# Altium footprint library pinghengche.PcbLib: 128 footprints (part 4 of 8)
Each footprint in its own frame and in the unit in brackets; x right, y up, seen from the top. Pads: shape width x height; smd on the part's side, far side on the other; paste and mask are expansions set on the pad; w line width, h text height; cw(c..) or ccw(c..) is an arc to the next point about the centre after c.
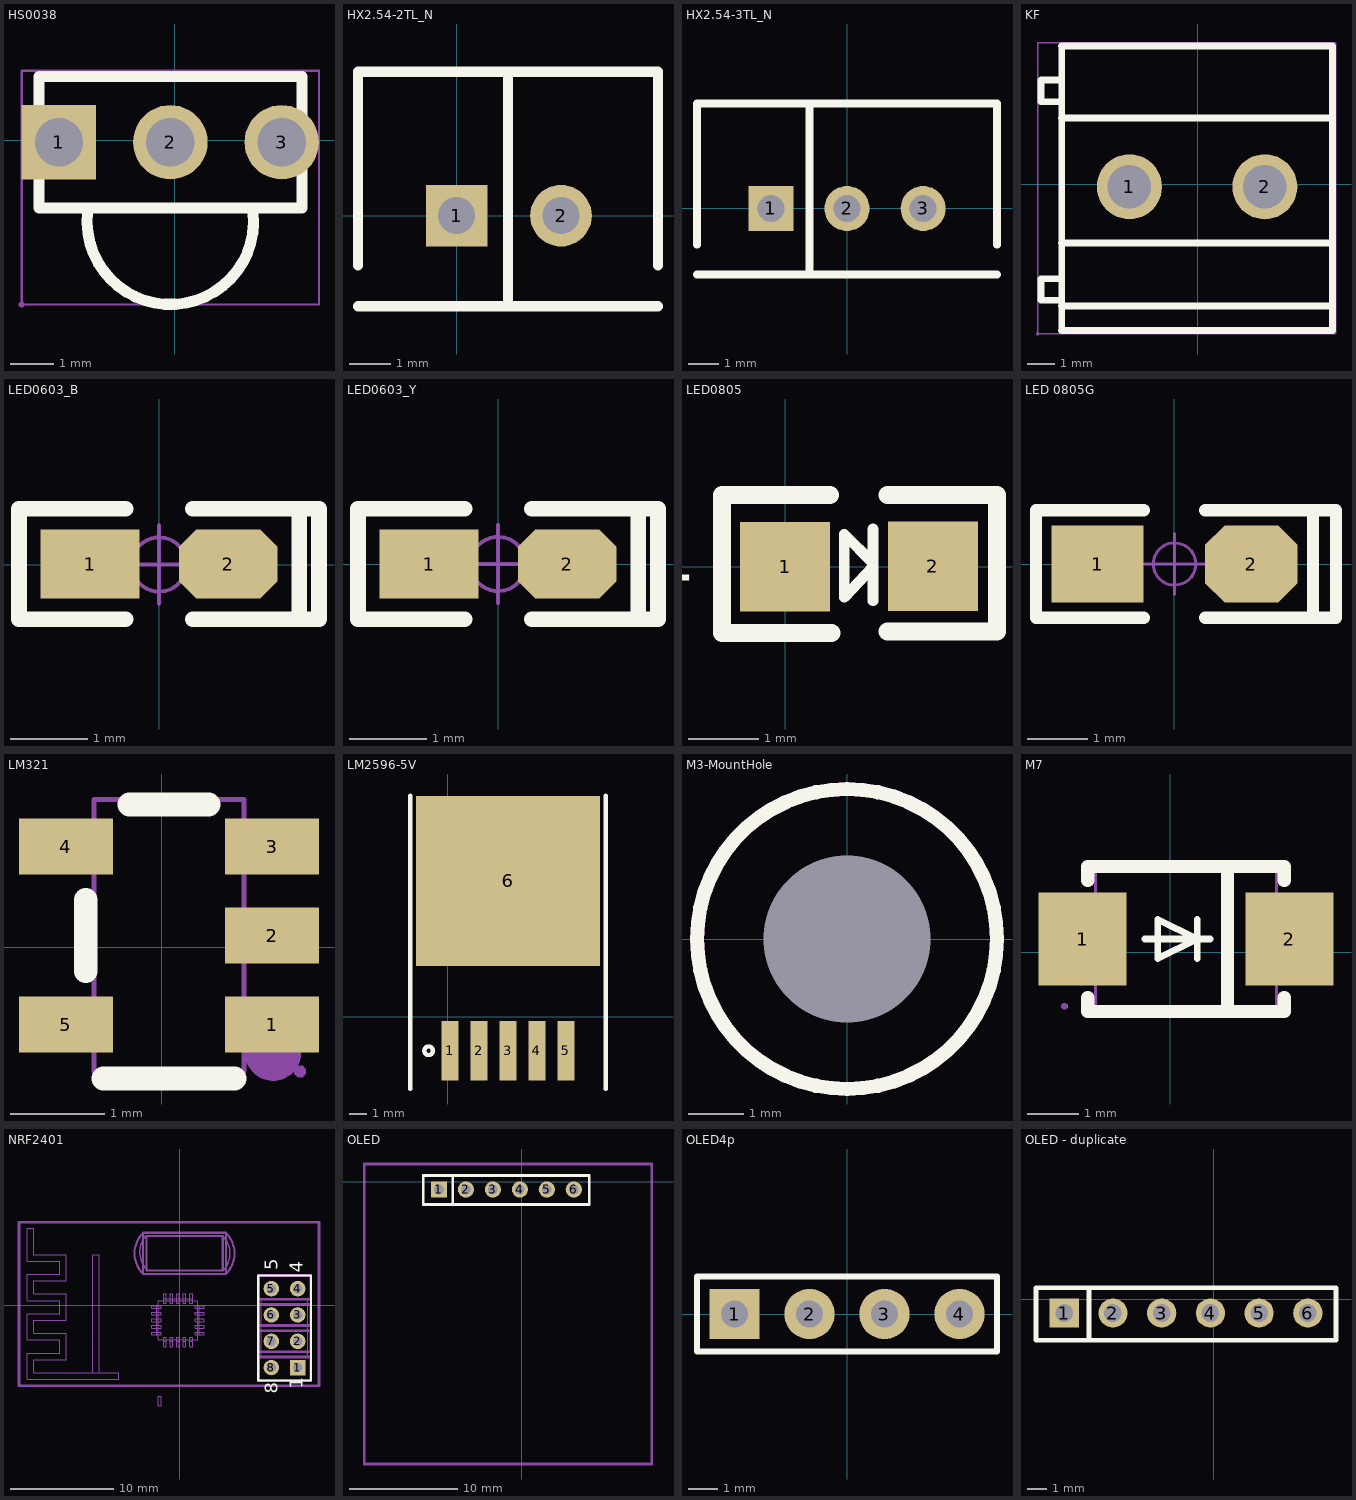
[diagram p3: the footprints below, top view; thin cyan lines are the x and y axes]

## HS0038 [mm]
pads (3):
  rect 1.699x1.699 hole 1.1 mask+0.051: 1(-2.644,-0.048)
  round 1.699 hole 1.1 mask+0.051: 2(-0.104,-0.048) 3(2.436,-0.048)
Top Overlay:
  lines w0.254: -1.994,-1.65 ccw(c-0.104,-1.848) 1.785,-1.65 ; -3.104,-1.547 2.896,-1.547 2.896,1.453 -3.104,1.453 -3.104,-1.547
Mechanical 15:
  region: -2.195,-0.048 -2.195,0.041 -2.263,0.206 -2.389,0.333 -2.555,0.401 -2.734,0.401 -2.899,0.333 -3.025,0.206 -3.094,0.041 -3.094,-0.048 -3.094,-0.138 -3.025,-0.303 -2.899,-0.429 -2.734,-0.498 -2.555,-0.498 -2.389,-0.429 -2.263,-0.303 -2.195,-0.138
  region: 0.345,-0.048 0.345,0.041 0.277,0.206 0.151,0.333 -0.015,0.401 -0.194,0.401 -0.359,0.333 -0.485,0.206 -0.554,0.041 -0.554,-0.048 -0.554,-0.138 -0.485,-0.303 -0.359,-0.429 -0.194,-0.498 -0.015,-0.498 0.151,-0.429 0.277,-0.303 0.345,-0.138
  region: 2.885,-0.048 2.885,0.041 2.817,0.206 2.691,0.333 2.525,0.401 2.346,0.401 2.181,0.333 2.055,0.206 1.986,0.041 1.986,-0.048 1.986,-0.138 2.055,-0.303 2.181,-0.429 2.346,-0.498 2.525,-0.498 2.691,-0.429 2.817,-0.303 2.885,-0.138
  region: -3.434,-3.749 -3.434,-3.724 -3.47,-3.688 -3.52,-3.688 -3.556,-3.724 -3.556,-3.749 -3.556,-3.774 -3.52,-3.81 -3.47,-3.81 -3.434,-3.774
  lines w0.051: -3.495,-3.749 3.287,-3.749 3.287,1.58 -3.495,1.58 -3.495,-3.749

## HX2.54-2TL_N [mm] "两针白色插座（未加焊）"
pads (2):
  rect 1.5x1.5 hole 0.9: 1(0,0)
  round 1.5 hole 0.9: 2(2.54,0)
Top Overlay:
  lines w0.254: -2.4,-2.2 4.9,-2.2 ; -2.4,-1.206 -2.4,3.5 4.9,3.5 4.9,-1.206 ; 1.25,-2.2 1.25,3.5
3D body "sip2_n.stp": height 7, standoff -3, extent -2.485,-2.455 5.015,3.545

## HX2.54-3TL_N [mm] "三针白色插座（未加焊）"
pads (3):
  rect 1.5x1.5 hole 0.9: 1(-2.54,0)
  round 1.5 hole 0.9: 2(0,0) 3(2.54,0)
Top Overlay:
  lines w0.254: -5,-2.2 5,-2.2 ; -5,-1.206 -5,3.5 5,3.5 5,-1.206 ; -1.25,-2.2 -1.25,3.5
3D body "hx254-3tl_n.stp": height 7, standoff -3, extent -5.005,-2.47 4.995,3.53

## KF [mil]
pads (2):
  round 94.5 hole 63 mask+2: 1(-99.2,-3.9) 2(97.6,-3.9)
Top Overlay:
  lines w10: -197.7,-212.6 196.1,-212.6 196.1,200.8 -197.7,200.8 ; -197.7,-177.3 196.1,-177.3 ; -197.7,-85.5 196.1,-85.5 ; -197.7,96 196.1,96 ; -197.6,-212.6 -197.6,200.8 ; -197.6,-168.9 -227.6,-168.9 -227.6,-137.5 -197.6,-137.5 ; -197.6,119.7 -227.6,119.7 -227.6,151.1 -197.6,151.1
Mechanical 15:
  region: -71.6,-3.9 -71.6,-0.27 -73.48,6.75 -77.11,13.05 -82.25,18.19 -88.55,21.82 -95.57,23.7 -102.83,23.7 -109.85,21.82 -116.15,18.19 -121.29,13.05 -124.92,6.75 -126.8,-0.27 -126.8,-3.9 -126.8,-7.53 -124.92,-14.55 -121.29,-20.85 -116.15,-25.99 -109.85,-29.62 -102.83,-31.5 -95.57,-31.5 -88.55,-29.62 -82.25,-25.99 -77.11,-20.85 -73.48,-14.55 -71.6,-7.53
  region: 125.2,-3.9 125.2,-0.27 123.32,6.75 119.69,13.05 114.55,18.19 108.25,21.82 101.23,23.7 93.97,23.7 86.95,21.82 80.65,18.19 75.51,13.05 71.88,6.75 70,-0.27 70,-3.9 70,-7.53 71.88,-14.55 75.51,-20.85 80.65,-25.99 86.95,-29.62 93.97,-31.5 101.23,-31.5 108.25,-29.62 114.55,-25.99 119.69,-20.85 123.32,-14.55 125.2,-7.53
  region: -230.2,-217.6 -230.2,-216.61 -231.61,-215.2 -233.59,-215.2 -235,-216.61 -235,-217.6 -235,-218.59 -233.59,-220 -231.61,-220 -230.2,-218.59
  lines w2: -232.6,-217.6 201.1,-217.6 201.1,205.8 -232.6,205.8 -232.6,-217.6

## LED0603_B [mil] "蓝色0603LED"
pads (2):
  rect 50x35 smd: 1(-35,0.26)
  oct 50x35 smd: 2(35,0.26)
Top Overlay:
  lines w8: -17,-27.74 -71,-27.74 -71,-25.74 -71,28.26 -70,28.26 -17,28.26 ; 17,-27.74 70,-27.74 ; 17,28.26 71,28.26 81,28.26 81,-27.74 71,-27.74 71,26.26
Mechanical 15:
  circle w1.97: c0,0 r13.78
  lines w1.97: -19.68,0 19.68,0 ; 0,-19.68 0,19.68
3D body "LED 0603玻璃罩.": height 0, standoff 0, extent 0,0 0,0
3D body "LED_0603-B.STEP": height 18.33, standoff -0.04, extent -31.5,-15.79 31.49,15.79

## LED0603_Y [mil] "黄色0603LED"
pads (2):
  rect 50x35 smd: 1(-35,0)
  oct 50x35 smd: 2(35,0)
Top Overlay:
  lines w8: -17,-28 -71,-28 -71,-26 -71,28 -70,28 -17,28 ; 17,-28 70,-28 ; 17,28 71,28 81,28 81,-28 71,-28 71,26
Mechanical 15:
  circle w1.97: c0,0 r13.78
  lines w1.97: -19.68,0 19.68,0 ; 0,-19.68 0,19.68
3D body "LED 0603玻璃罩.": height 0, standoff 0, extent 0,0 0,0
3D body "LED_0603-Y.STEP": height 18.33, standoff -0.04, extent -31.5,-15.8 31.49,15.78

## LED0805 [mm] "1/8W"
pads (2):
  rect 1.27x1.27 smd: 1(0,0) 2(2.09,0.005)
Top Overlay:
  lines w0.152: 1.245,-0.483 1.245,0.533 ; 1.245,0 0.838,-0.432 0.838,0.457 1.245,0.051
  lines w0.254: 0.635,1.016 -0.889,1.016 -0.889,-0.94 0.66,-0.94 ; 1.448,-0.914 2.997,-0.914 2.997,1.016 1.448,1.016
  text "+" at -1.245,-0.483 h0.76
3D body: height 0.5, standoff 0, extent 0.279,-0.635 1.803,0.635
3D body: height 0.5, standoff 0, extent 1.803,-0.635 2.032,0.635
3D body: height 0.5, standoff 0, extent 0.051,-0.635 0.279,0.635
3D body: height 0.46, standoff 0, extent 0.774,-0.254 1.309,0.305

## LED 0805G [mil] "绿色0805LED"
pads (2):
  rect 60x50 smd: 1(-50,0)
  oct 60x50 smd: 2(50,0)
Top Overlay:
  lines w8: -20,-35 -90,-35 -90,35 -20,35 ; 20,-35 105,-35 105,35 20,35 ; 90,-35 90,35
Mechanical 15:
  circle w1.97: c0,0 r13.78
  lines w1.97: -19.68,0 19.68,0 ; 0,-19.68 0,19.68
3D body "LED 0805玻璃罩.STEP": height 31.69, standoff 12.01, extent -29.49,-24.65 29.49,24.65
3D body "LED 0805-G.STEP": height 26.33, standoff -0.16, extent -39.37,-24.65 39.37,24.65

## LM321 [mil]
pads (5):
  rect 39.4x23.6 smd mask+1.97: 1(46.3,-32.4) 2(46.3,5) 3(46.3,42.4) 4(-40.3,42.4) 5(-40.3,-32.4)
Top Overlay:
  lines w10: -32,-10 -32,20 ; -24.5,-55 30.5,-55 ; -13.6,60 19.6,60
Mechanical 6:
  circle w11.8: c46.7,-44.2 r5.9
Mechanical 15:
  region: 60.5,-52.1 60.5,-51.11 59.09,-49.7 57.11,-49.7 55.7,-51.11 55.7,-52.1 55.7,-53.09 57.11,-54.5 59.09,-54.5 60.5,-53.09
  region: -34.4,-40.3 -52.1,-40.3 -52.1,-24.5 -34.4,-24.5
  region: -28.1,-40.3 -34.8,-40.3 -34.8,-24.5 -28.1,-24.5
  region: -34.4,34.5 -52.1,34.5 -52.1,50.3 -34.4,50.3
  region: -28.1,34.5 -34.8,34.5 -34.8,50.3 -28.1,50.3
  region: 58.1,-40.3 40.4,-40.3 40.4,-24.5 58.1,-24.5
  region: 40.8,-40.3 34.1,-40.3 34.1,-24.5 40.8,-24.5
  region: 58.1,34.5 40.4,34.5 40.4,50.3 58.1,50.3
  region: 40.8,34.5 34.1,34.5 34.1,50.3 40.8,50.3
  region: 58.1,-2.9 40.4,-2.9 40.4,12.9 58.1,12.9
  region: 40.8,-2.9 34.1,-2.9 34.1,12.9 40.8,12.9
  lines w2: -28.5,-52.1 34.5,-52.1 34.5,62.1 -28.5,62.1 -28.5,-52.1

## LM2596-5V [mm]
pads (6):
  rect 1x3.5 smd: 1(0.147,-1.995) 2(1.847,-1.995) 3(3.547,-1.995) 4(5.247,-1.995) 5(6.947,-1.995)
  rect 10.8x10 smd: 6(3.547,8.005)
Top Overlay:
  circle w0.254: c-1.123,-1.995 r0.254
  lines w0.254: -2.203,-4.245 -2.203,13.005 ; 9.297,-4.245 9.297,13.005
3D body "User Library-TO-263-5.STEP": height 4.56, standoff 0, extent -1.533,-2.245 8.627,11.77

## M3-MountHole [mm]
height 2
pads (1):
  rect 0x0 hole 3 unplated: 1(0,0)
Top Overlay:
  circle w0.254: c0,0 r2.7
Bottom Overlay:
  circle w0.254: c0,0 r2.7
Keep-Out Layer:
  circle w0.254: c0,0 r2.7

## M7 [mm]
pads (2):
  rect 1.699x1.801 smd mask+0.051: 1(-1.69,0.257) 2(2.308,0.257)
Top Overlay:
  lines w0.127: -0.491,0.257 0.779,0.257 ; 0.525,-0.124 0.525,0.257 ; 0.525,0.638 0.525,0.257 ; 0.525,0.257 -0.237,-0.124 -0.237,0.257 -0.237,0.638 0.525,0.257
  lines w0.254: -1.591,-0.874 -1.591,-1.143 2.209,-1.143 2.209,-0.874 ; -1.591,1.387 -1.591,1.656 2.209,1.656 2.209,1.387 ; 1.109,-0.993 1.109,1.506
Mechanical 6:
  region: -2.292,0.356 -0.89,0.356 -0.89,0.157 -2.292,0.157
  region: -1.69,-0.445 -1.69,0.958 -1.492,0.958 -1.492,-0.445
  region: 1.507,0.356 2.91,0.356 2.91,0.157 1.507,0.157
Mechanical 15:
  region: -1.98,-1.044 -1.98,-1.019 -2.016,-0.983 -2.066,-0.983 -2.102,-1.019 -2.102,-1.044 -2.102,-1.069 -2.066,-1.105 -2.016,-1.105 -1.98,-1.069
  region: 2.658,-0.493 1.81,-0.493 1.81,1.006 2.658,1.006
  region: -2.041,1.006 -1.193,1.006 -1.193,-0.493 -2.041,-0.493
  lines w0.051: -1.441,-1.044 2.059,-1.044 2.059,1.557 -1.441,1.557 -1.441,-1.044

## NRF2401 [mm]
pads (8):
  rect 1.5x1.5 hole 0.9: 1(11.379,-6.02)
  round 1.5 hole 0.9: 2(11.379,-3.48) 3(11.379,-0.94) 4(11.379,1.6) 5(8.839,1.6) 6(8.839,-0.94) 7(8.839,-3.48) 8(8.839,-6.02)
Top Overlay:
  lines w0.2: 7.569,-7.29 7.569,2.87 12.649,2.87 12.649,-7.29 7.569,-7.29
  text "5" at 9.474,3.378 h1.27
  text "1" at 11.887,-8.052 h1.27
  text "4" at 11.887,3.124 h1.27
  text "8" at 9.474,-8.56 h1.27
Mechanical 1:
  drawing of 171 lines, arcs and shapes, not listed
3D body: height 2, standoff 0, extent 7.569,0.584 12.649,2.87
3D body: height 2, standoff 0, extent 7.842,0.076 12.342,0.584
3D body: height 2, standoff 0, extent 7.569,-1.956 12.649,0.076
3D body: height 2, standoff 0, extent 7.842,-2.488 12.342,-1.956
3D body: height 2, standoff 0, extent 7.569,-4.496 12.649,-2.464
3D body: height 2, standoff 0, extent 7.842,-5.004 12.342,-4.496
3D body: height 2, standoff 0, extent 7.569,-7.29 12.649,-5.004
3D body: height 3, standoff 2, extent -15.558,-7.788 13.442,8.012
3D body: height 4, standoff 0, extent 8.492,1.251 9.189,1.95
3D body: height 4, standoff 0, extent 11.032,1.251 11.729,1.95
3D body: height 4, standoff 0, extent 8.492,-1.289 9.189,-0.59
3D body: height 4, standoff 0, extent 11.032,-1.289 11.729,-0.59
3D body: height 4, standoff 0, extent 8.492,-3.829 9.189,-3.13
3D body: height 4, standoff 0, extent 11.032,-3.829 11.729,-3.13
3D body: height 4, standoff 0, extent 8.492,-6.369 9.189,-5.67
3D body: height 4, standoff 0, extent 11.032,-6.369 11.729,-5.67
3D body: height 4, standoff 0, extent 11.032,-6.369 11.729,-5.67
3D body: height 4, standoff 0, extent 8.492,-6.369 9.189,-5.67
3D body: height 4, standoff 0, extent 8.492,-3.829 9.189,-3.13
3D body: height 4, standoff 0, extent 11.032,-3.829 11.729,-3.13
3D body: height 4, standoff 0, extent 11.032,-1.289 11.729,-0.59
3D body: height 4, standoff 0, extent 8.492,-1.289 9.189,-0.59
3D body: height 4, standoff 0, extent 8.492,1.251 9.189,1.95
3D body: height 4, standoff 0, extent 11.032,1.251 11.729,1.95
3D body: height 3.5, standoff 3, extent -3.558,3.012 4.442,7.012
3D body: height 3.5, standoff 3, extent -4.641,2.917 -0.458,7.108
3D body: height 3.5, standoff 3, extent 1.359,2.917 5.542,7.108
3D body: height 5, standoff 3, extent -4.043,3.313 -0.617,6.746
3D body: height 5, standoff 3, extent 1.291,3.44 4.717,6.873
3D body: height 5, standoff 3.5, extent -3.226,3.378 4.14,6.68
3D body: height 3.5, standoff 3, extent -2.083,-3.353 1.727,0.457
3D body: height 3.1, standoff 3, extent -1.575,-3.988 -1.321,-3.48
3D body: height 3.1, standoff 3, extent -0.94,-3.988 -0.686,-3.498
3D body: height 3.1, standoff 3, extent -0.305,-3.983 -0.051,-3.493
3D body: height 3.1, standoff 3, extent 0.33,-3.988 0.584,-3.498
3D body: height 3.1, standoff 3, extent 0.965,-3.988 1.219,-3.498
3D body: height 3.1, standoff 3, extent 1.882,-2.845 2.362,-2.578
3D body: height 3.1, standoff 3, extent 1.882,-2.21 2.362,-1.956
3D body: height 3.1, standoff 3, extent 1.882,-1.575 2.362,-1.321
3D body: height 3.1, standoff 3, extent 1.882,-0.94 2.362,-0.686
3D body: height 3.1, standoff 3, extent 1.882,-0.305 2.362,-0.051
3D body: height 3.1, standoff 3, extent 0.965,0.612 1.219,1.092
3D body: height 3.1, standoff 3, extent 0.33,0.612 0.584,1.092
3D body: height 3.1, standoff 3, extent -0.305,0.612 -0.051,1.092
3D body: height 3.1, standoff 3, extent -0.94,0.612 -0.686,1.092
3D body: height 3.1, standoff 3, extent -1.575,0.612 -1.321,1.092
3D body: height 3.1, standoff 3, extent -2.718,-0.318 -2.238,-0.051
3D body: height 3.1, standoff 3, extent -2.718,-0.94 -2.248,-0.686
3D body: height 3.1, standoff 3, extent -2.718,-1.575 -2.238,-1.321
3D body: height 3.1, standoff 3, extent -2.718,-2.21 -2.248,-1.956
3D body: height 3.1, standoff 3, extent -2.718,-2.845 -2.248,-2.591
3D body: height 3.25, standoff 3, extent -1.575,0.203 -1.321,0.612
3D body: height 3.25, standoff 3, extent -0.94,0.203 -0.686,0.612
3D body: height 3.25, standoff 3, extent -0.305,0.203 -0.051,0.612
3D body: height 3.25, standoff 3, extent 0.33,0.203 0.584,0.612
3D body: height 3.25, standoff 3, extent 0.965,0.203 1.219,0.612
3D body: height 3.25, standoff 3, extent 1.473,-0.305 1.892,-0.051
3D body: height 3.25, standoff 3, extent 1.473,-0.94 1.882,-0.686
3D body: height 3.25, standoff 3, extent 1.473,-1.588 1.882,-1.321
3D body: height 3.25, standoff 3, extent 1.473,-2.21 1.882,-1.956
3D body: height 3.25, standoff 3, extent 1.473,-2.845 1.882,-2.591
3D body: height 3.25, standoff 3, extent 0.965,-3.498 1.219,-3.099
3D body: height 3.25, standoff 3, extent 0.33,-3.498 0.584,-3.099
3D body: height 3.25, standoff 3, extent -0.305,-3.498 -0.051,-3.099
3D body: height 3.25, standoff 3, extent -0.94,-3.498 -0.686,-3.099
3D body: height 3.25, standoff 3, extent -1.575,-3.48 -1.321,-3.099
3D body: height 3.25, standoff 3, extent -2.248,-2.845 -1.829,-2.591
3D body: height 3.25, standoff 3, extent -2.238,-2.21 -1.829,-1.956
3D body: height 3.25, standoff 3, extent -2.238,-1.575 -1.829,-1.321
3D body: height 3.25, standoff 3, extent -2.238,-0.94 -1.829,-0.686
3D body: height 3.25, standoff 3, extent -2.238,-0.305 -1.829,-0.051
3D body: height 3.01, standoff 3, extent -14.783,-7.163 -5.893,7.442
3D body: height 3.01, standoff 3, extent -8.433,-6.528 -7.798,4.902

## OLED [mm]
pads (6):
  rect 1.5x1.5 hole 0.9: 1(-7.671,-0.711)
  round 1.5 hole 0.9: 2(-5.171,-0.711) 3(-2.671,-0.711) 4(-0.171,-0.711) 5(2.329,-0.711) 6(4.829,-0.711)
Top Overlay:
  lines w0.254: -6.401,-2.057 -6.401,0.533 ; -9.119,-2.108 -9.119,0.584 6.274,0.584 6.274,-2.108 -9.119,-2.108
Mechanical 1:
  lines w0.254: -14.605,-26.162 12.065,-26.162 12.065,1.651 -14.605,1.651 -14.605,-26.162
3D body "User Library-RM254_4pin.STEP": height 6.02, standoff -3.1, extent -6.655,-2.108 3.505,0.432
3D body "User Library-128x64I2COLEDDisplayAdafruit.STEP": height 10.47, standoff -0.37, extent -14.63,-26.198 12.07,1.662

## OLED4p [mm] "排母，4脚"
pads (4):
  rect 1.7x1.7 hole 0.9: 1(-3.81,0)
  round 1.7 hole 0.9: 2(-1.27,0) 3(1.27,0) 4(3.81,0)
Top Overlay:
  lines w0.2: -5.08,-1.27 5.08,-1.27 5.08,1.27 -5.08,1.27 -5.08,-1.27
3D body "HDR2.54-1P_M.STEP": height 8.5, standoff -3, extent -2.54,-1.27 0,1.27
3D body "HDR2.54-1P_M.STEP": height 8.5, standoff -3, extent -5.08,-1.27 -2.54,1.27
3D body "HDR2.54-1P_M.STEP": height 8.5, standoff -3, extent 2.54,-1.27 5.08,1.27
3D body "HDR2.54-1P_M.STEP": height 8.5, standoff -3, extent 0,-1.27 2.54,1.27
3D body "User Library-128x64I2COLEDDisplayAdafruit.STEP": height 10.47, standoff -0.37, extent -13.35,-26.844 13.35,1.016

## OLED - duplicate [mm]
pads (6):
  rect 1.5x1.5 hole 0.9: 1(-7.671,-0.711)
  round 1.5 hole 0.9: 2(-5.171,-0.711) 3(-2.671,-0.711) 4(-0.171,-0.711) 5(2.329,-0.711) 6(4.829,-0.711)
Top Overlay:
  lines w0.254: -6.401,-2.057 -6.401,0.533 ; -9.119,-2.108 6.274,-2.108 6.274,0.584 -9.119,0.584 -9.119,-2.108
3D body "User Library-128x64I2COLEDDisplayAdafruit.STEP": height 10.47, standoff -0.37, extent -14.63,-26.198 12.07,1.662
3D body "User Library-RM254_4pin.STEP": height 6.02, standoff -3.1, extent -6.655,-2.108 3.505,0.432